# Altium footprint library Transistor.PcbLib: 86 footprints (part 1 of 6)
Each footprint in its own frame and in the unit in brackets; x right, y up, seen from the top. Pads: shape width x height; smd on the part's side, far side on the other; paste and mask are expansions set on the pad; w line width, h text height; cw(c..) or ccw(c..) is an arc to the next point about the centre after c.
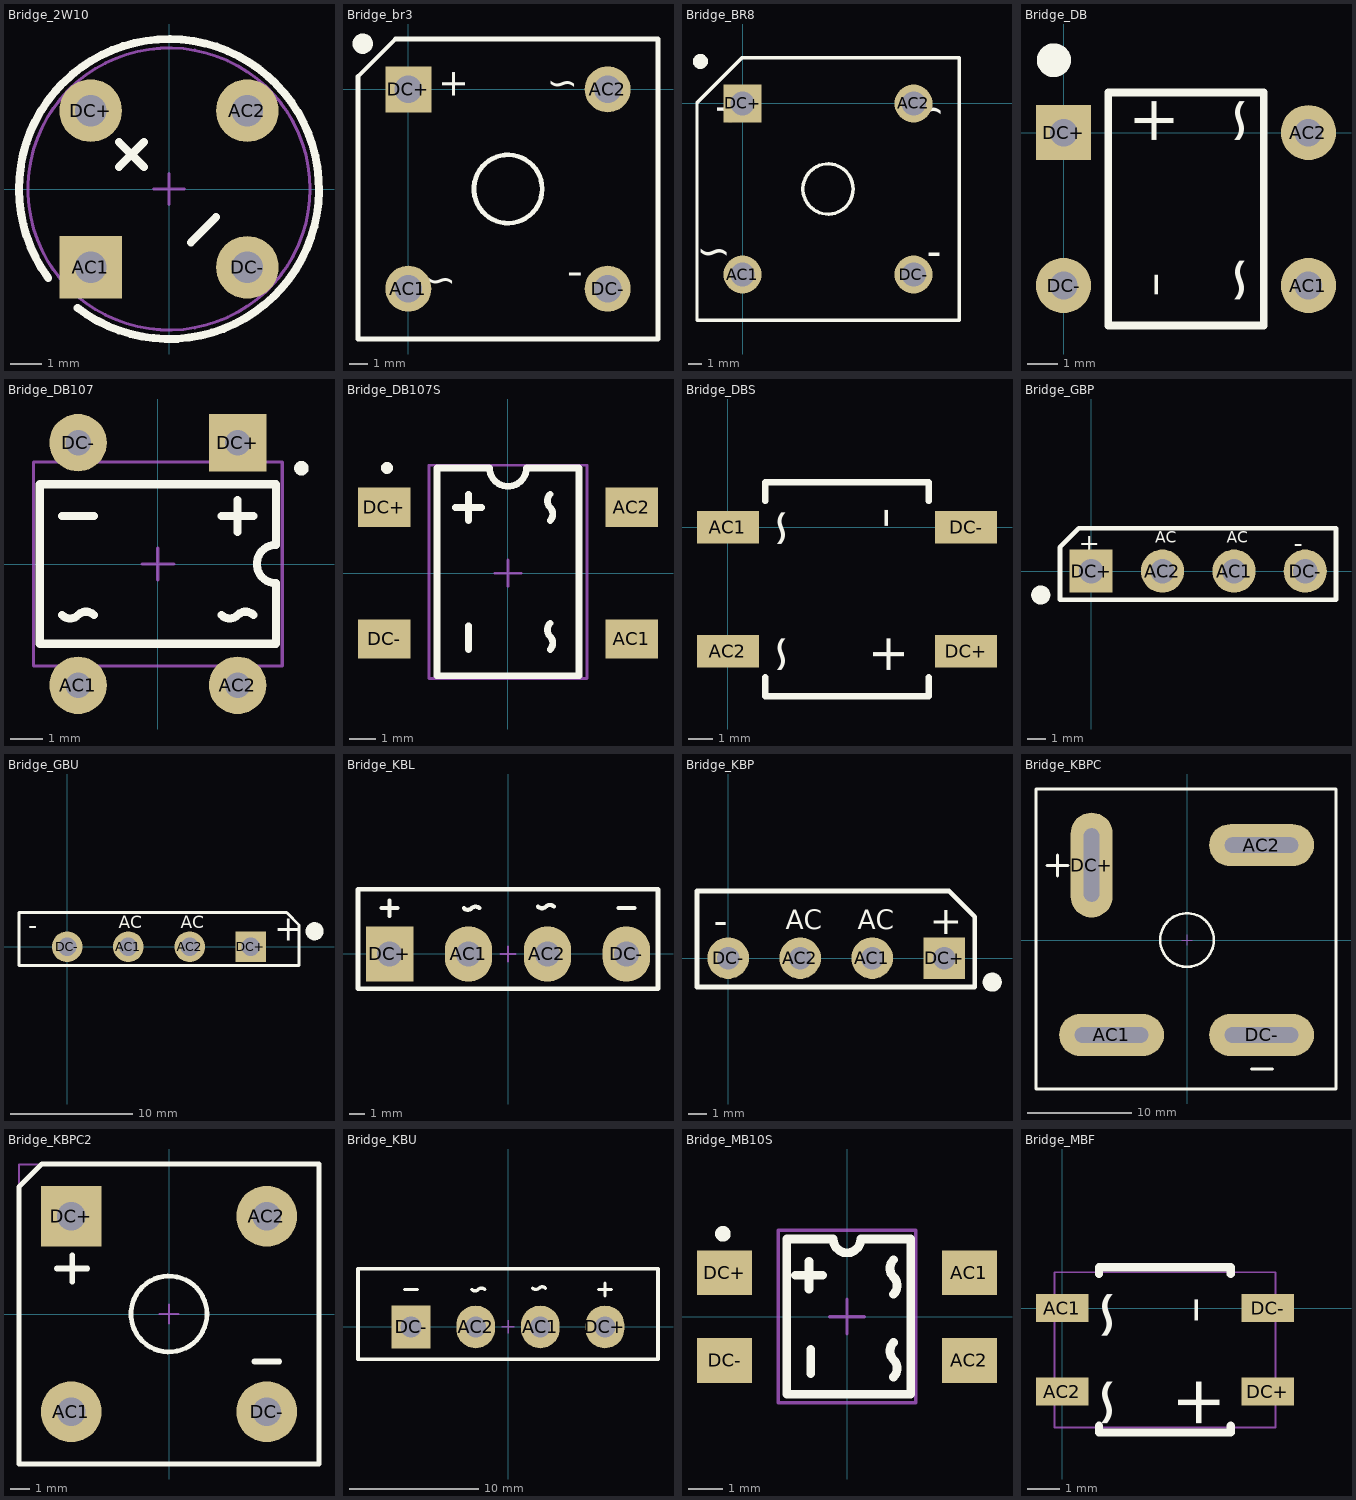
[diagram p0: the footprints below, top view; thin cyan lines are the x and y axes]

## Bridge_2W10 [mm]
pads (4):
  rect 2x2 hole 1: AC1(-2.5,-2.5)
  round 2 hole 1: AC2(2.5,2.5) DC+(-2.5,2.5) DC-(2.5,-2.5)
Top Overlay:
  lines w0.254: -3.853,-2.839 cw(c0,0) -2.918,-3.793 ; -1.6,0.7 -0.8,1.5 ; -1.6,1.5 -0.8,0.7 ; 0.7,-1.7 1.5,-0.9
Mechanical 15:
  circle w0.1: c0,0 r4.5
  lines w0.1: -0.5,0 0.5,0 ; 0,-0.5 0,0.5
3D body "2W10 2A fi 9mm x 7mm.step": height 8, standoff -10, extent -4.5,-4.5 4.5,4.5

## Bridge_br3 [mm]
pads (4):
  round 2.5 hole 1.5: AC1(0,-10.8) AC2(10.8,0) DC-(10.8,-10.8)
  rect 2.5x2.5 hole 1.5: DC+(0,0)
Top Overlay:
  circle w0.254: c5.4,-5.4 r1.85
  circle w0.6: c-2.474,2.474 r0.254
  lines w0.254: -2.728,-13.528 -2.728,0.696 -0.696,2.728 13.528,2.728 13.528,-13.528 -2.728,-13.528
  text "+" at 1.336,-0.574 h2.54
  text "-" at 9.464,-11.242 h3.05
  text "~" at 9.21,-0.828 h2.54
  text "~" at 2.606,-11.496 h2.54
3D body "br3-.STEP": height 6, standoff -3.5, extent -2.667,-13.461 13.333,2.539

## Bridge_BR8 [mm]
pads (4):
  round 2.8 hole 1.8: AC1(0,-12.6) AC2(12.6,0) DC-(12.6,-12.6)
  rect 2.8x2.8 hole 1.8: DC+(0,0)
Top Overlay:
  circle w0.254: c6.3,-6.3 r1.85
  circle w0.6: c-3.098,3.098 r0.254
  lines w0.254: -3.352,-15.952 -3.352,0.05 -0.05,3.352 15.952,3.352 15.952,-15.952 -3.352,-15.952
  text "+" at -2.59,-1.728 h3.81
  text "-" at 14.682,-12.65 h3.81
  text "~" at 14.936,-2.236 h3.81
  text "~" at -0.812,-12.65 h3.81
3D body "BR8-.STEP": height 7.1, standoff -3.5, extent -3.1,-15.852 15.8,3.048

## Bridge_DB [mm]
pads (4):
  round 1.8 hole 0.9: AC1(8.008,-5) AC2(8.008,0) DC-(0,-5)
  rect 1.8x1.8 hole 0.9: DC+(0,0)
Top Overlay:
  circle w0.6: c-0.314,2.366 r0.254
  lines w0.254: 1.464,-6.31 1.464,1.31 6.544,1.31 6.544,-6.31 1.464,-6.31
  text "+" at 1.845,-0.468 h2.54
  text "-" at 1.845,-5.421 h3.05
  text "~" at 4.639,-0.468 h2.54
  text "~" at 4.639,-5.675 h2.54
3D body "DB-.STEP": height 3.2, standoff -3.01, extent -0.49,-6.79 8.382,1.71

## Bridge_DB107 [mm]
pads (4):
  round 1.8 hole 0.8: AC1(-2.5,-3.8) AC2(2.5,-3.8) DC-(-2.5,3.8)
  rect 1.8x1.8 hole 0.8: DC+(2.5,3.8)
Top Overlay:
  circle w0.254: c4.5,3 r0.1
  lines w0.254: -3,-1.6 ccw(c-2.75,-1.35) -2.5,-1.6 cw(c-2.25,-1.85) -2,-1.6 ; -3,1.5 -2,1.5 ; 2,-1.6 ccw(c2.25,-1.35) 2.5,-1.6 cw(c2.75,-1.85) 3,-1.6 ; 2,1.5 3,1.5 ; 2.5,1 2.5,2 ; -3.7,-2.5 3.7,-2.5 3.7,-0.6 cw(c3.7,0) 3.7,0.6 3.7,2.5 -3.7,2.5 -3.7,-2.5
Mechanical 15:
  lines w0.1: -0.5,0 0.5,0 ; 0,-0.5 0,0.5 ; -3.9,-3.2 3.9,-3.2 3.9,3.2 -3.9,3.2 -3.9,-3.2
3D body "DB107.STEP": height 3.8, standoff -2.7, extent -3.85,-3.983 3.85,4

## Bridge_DB107S [mm]
pads (4):
  rect 2x1.5 smd: AC1(4.7,-2.5) AC2(4.7,2.5) DC+(-4.7,2.5) DC-(-4.7,-2.5)
Top Overlay:
  circle w0.254: c-4.6,4 r0.1
  lines w0.254: -2,2.5 -1,2.5 ; -1.5,-2.9 -1.5,-2 ; -1.5,2 -1.5,3 ; 1.6,-2.9 ccw(c1.35,-2.65) 1.6,-2.4 cw(c1.85,-2.15) 1.6,-1.9 ; 1.6,2 ccw(c1.35,2.25) 1.6,2.5 cw(c1.85,2.75) 1.6,3 ; -2.7,-3.9 -2.7,4 -0.7,4 ccw(c0,4) 0.7,4 2.7,4 2.7,-3.9 -2.7,-3.9
Mechanical 15:
  lines w0.1: -0.5,0 0.5,0 ; 0,-0.5 0,0.5 ; -3,-4 3,-4 3,4.1 -3,4.1 -3,-4
3D body "DB107S.STEP": height 2.7, standoff 0, extent -5.075,-4 5.075,4.1

## Bridge_DBS [mm]
height 12.3
pads (4):
  rect 2.5x1.3 smd: AC1(0,0) AC2(0,-5) DC+(9.6,-5) DC-(9.6,0)
Top Overlay:
  lines w0.254: 1.498,-6.056 1.498,-6.818 8.102,-6.818 8.102,-6.056 ; 1.498,1.056 1.498,1.818 8.102,1.818 8.102,1.056
  text "+" at 7.594,-4.278 h2.54
  text "-" at 7.594,0.802 h3.05
  text "~" at 3.276,-4.278 h2.54
  text "~" at 3.276,0.802 h2.54
3D body "DBS-.STEP": height 3.1, standoff -0.03, extent -0.351,-6.731 9.749,1.769

## Bridge_GBP [mm]
pads (4):
  round 2.3 hole 1.3: AC1(7.61,0) AC2(3.8,0) DC-(11.4,0)
  rect 2.3x2.3 hole 1.3: DC+(0,0)
Top Overlay:
  circle w0.508: c-2.682,-1.27 r0.254
  lines w0.254: -1.66,-1.524 -1.66,1.276 -0.65,2.286 13.04,2.286 13.04,-1.524 -1.66,-1.524
  text "AC" at 7.224,1.524 h0.6
  text "+" at -0.65,1.016 h1
  text "-" at 10.78,1.016 h1
  text "AC" at 3.414,1.524 h0.6
3D body "GBP-.STEP": height 12.8, standoff -3.6, extent -1.385,-1.122 12.815,1.778

## Bridge_GBU [mm]
pads (4):
  round 2.5 hole 1.5: AC1(5,0) AC2(10,0) DC-(0,0)
  rect 2.5x2.5 hole 1.5: DC+(15,0)
Top Overlay:
  circle w0.762: c20.2,1.27 r0.359
  lines w0.254: -3.93,-1.524 -3.93,2.794 -0.922,2.794 17.914,2.794 18.93,1.778 18.93,-1.524 -3.93,-1.524
  text "-" at -3.168,1.016 h1.52
  text "+" at 16.898,0.508 h2.03
  text "AC" at 4.198,1.524 h1.02
  text "AC" at 9.278,1.524 h1.02
3D body "GBU-.STEP": height 20.8, standoff -4, extent -3.507,-1.087 18.493,2.413

## Bridge_KBL [mm]
pads (4):
  oval 3x3.5 hole 1.6: AC1(-2.5,0) AC2(2.5,0) DC-(7.5,0)
  rect 3x3.5 hole 1.6: DC+(-7.5,0)
Top Overlay:
  lines w0.254: -8,2.9 -7,2.9 ; -7.5,2.4 -7.5,3.4 ; -2.8,2.9 ccw(c-2.55,3.15) -2.3,2.9 cw(c-2.05,2.65) -1.8,2.9 ; 1.9,3 ccw(c2.15,3.25) 2.4,3 cw(c2.65,2.75) 2.9,3 ; 7,2.9 8,2.9
  lines w0.3: -9.5,-2.2 9.5,-2.2 9.5,4.1 -9.5,4.1 -9.5,-2.2
Mechanical 15:
  lines w0.1: -0.5,0 0.5,0 ; 0,-0.5 0,0.5 ; -9.5,-2.151 -9.5,4.1 9.5,4.1 9.5,-2.151 -9.5,-2.151
3D body "KBL.step": height 15.75, standoff -4.5, extent -9.5,-2.151 9.5,4.1

## Bridge_KBP [mm]
pads (4):
  round 2.2 hole 1.2: AC1(7.62,0) AC2(3.81,0) DC-(0,0)
  rect 2.2x2.2 hole 1.2: DC+(11.43,0)
Top Overlay:
  circle w0.508: c13.97,-1.27 r0.254
  lines w0.254: -1.65,-1.524 -1.65,3.55 11.69,3.55 13.05,2.19 13.05,-1.524 -1.65,-1.524
  text "+" at 10.668,1.27 h1.5
  text "-" at -0.762,1.27 h1.5
  text "AC" at 3.048,1.524 h1.02
  text "AC" at 6.858,1.524 h1.02
3D body "KBP-.STEP": height 11.7, standoff -3.1, extent -1.635,-1.244 13.065,3.556

## Bridge_KBPC [mm]
pads (4):
  oval 10x4 hole 1.5 slot 7 at 0 deg: AC1(-7.2,-9.05) AC2(7.1,9.05) DC-(7.1,-9.05)
  oval 4x10 hole 1.5 slot 7 at 90 deg: DC+(-9.1,7.15)
Top Overlay:
  circle w0.254: c0,0 r2.555
  lines w0.254: -14.4,-14.2 14.2,-14.2 14.2,14.4 -14.4,14.4 -14.4,-14.2
  lines w0.3: -13.35,7.1 -11.35,7.1 ; -12.35,6.1 -12.35,8.1 ; 6.15,-12.3 8.15,-12.3
Mechanical 15:
  lines w0.1: -0.5,0 0.5,0 ; 0,-0.5 0,0.5 ; -14.4,-14.2 14.2,-14.2 14.2,14.4 -14.4,14.4 -14.4,-14.2
3D body "KBPC 5012 F.step": height 7.5, standoff -14.5, extent -14.4,-14.2 14.2,14.4

## Bridge_KBPC2 [mm]
pads (4):
  round 3.2 hole 1.5: AC1(-5.15,-5.15) AC2(5.15,5.15) DC-(5.15,-5.15)
  rect 3.2x3.2 hole 1.5: DC+(-5.15,5.15)
Top Overlay:
  circle w0.254: c0,0 r2
  lines w0.254: -7.9,-7.9 -7.9,6.7 -6.7,7.9 7.9,7.9 7.9,-7.9 -7.9,-7.9
  lines w0.3: -5.9,2.4 -4.3,2.4 ; -5.1,1.7 -5.1,3.1 ; 4.5,-2.5 5.8,-2.5
Mechanical 15:
  lines w0.1: -0.5,0 0.5,0 ; 0,-0.5 0,0.5 ; -7.9,-7.875 7.85,-7.875 7.85,7.875 -7.9,7.875 -7.9,-7.875
3D body "KBPC.step": height 6.33, standoff -2, extent -7.9,-7.875 7.85,7.875

## Bridge_KBU [mm]
pads (4):
  oval 3x3.3 hole 1.6: AC1(2.5,0) AC2(-2.5,0) DC+(7.5,0)
  rect 3x3.3 hole 1.6: DC-(-7.5,0)
Top Overlay:
  lines w0.254: -8,2.9 -7,2.9 ; -2.8,2.9 ccw(c-2.55,3.15) -2.3,2.9 cw(c-2.05,2.65) -1.8,2.9 ; 1.9,3 ccw(c2.15,3.25) 2.4,3 cw(c2.65,2.75) 2.9,3 ; 7,2.9 8,2.9 ; 7.5,2.4 7.5,3.4
  lines w0.3: -11.6,-2.5 11.6,-2.5 11.6,4.5 -11.6,4.5 -11.6,-2.5
Mechanical 15:
  lines w0.1: -0.5,0 0.5,0 ; 0,-0.5 0,0.5 ; -11.6,-2.45 -11.6,4.5 11.6,4.5 11.6,-2.45 -11.6,-2.45
3D body "KBU1010.step": height 18.75, standoff -23.55, extent -11.6,-2.45 11.6,4.5

## Bridge_MB10S [mm]
pads (4):
  rect 1.6x1.3 smd: AC1(3.55,1.27) AC2(3.55,-1.27) DC+(-3.55,1.27) DC-(-3.55,-1.27)
Top Overlay:
  circle w0.254: c-3.6,2.4 r0.1
  lines w0.254: -1.5,1.2 -0.7,1.2 ; -1.1,0.8 -1.1,1.6 ; -1.05,-1.65 -1.05,-0.95 ; 1.35,-1.75 ccw(c1.1,-1.5) 1.35,-1.25 cw(c1.6,-1) 1.35,-0.75 ; 1.35,0.65 ccw(c1.1,0.9) 1.35,1.15 cw(c1.6,1.4) 1.35,1.65 ; -1.75,-2.25 1.85,-2.25 1.85,2.25 0.4,2.25 cw(c0,2.25) -0.4,2.25 -1.75,2.25 -1.75,-2.25
Mechanical 15:
  lines w0.1: -0.5,0 0.5,0 ; 0,-0.5 0,0.5 ; -2,-2.5 2,-2.5 2,2.5 -2,2.5 -2,-2.5
3D body "MB10S.STEP": height 2.9, standoff 0, extent -3.75,-2.45 3.85,2.45

## Bridge_MBF [mm]
height 12.3
pads (4):
  rect 1.6x0.85 smd: AC1(0,0) AC2(0,-2.54) DC+(6.254,-2.54) DC-(6.254,0)
Top Overlay:
  lines w0.254: 1.12,-3.581 1.12,-3.785 5.134,-3.785 5.134,-3.581 ; 1.12,1.041 1.12,1.245 5.134,1.245 5.134,1.041
  text "+" at 5.286,-2.032 h2.54
  text "-" at 5.286,0.381 h3.05
  text "~" at 2.492,-2.032 h2.54
  text "~" at 2.492,0.635 h2.54
Mechanical 13:
  lines w0.05: -0.236,-3.633 -0.236,1.092 6.49,1.092 6.49,-3.633 -0.236,-3.633
3D body "MBF-.STEP": height 1.6, standoff -0.03, extent -0.452,-3.556 6.548,1.144